# Altium schematic symbol library IC_ADI.SCHLIB: 3169 symbols (part 1 of 181) (continued)
## AD421BRZRL
designator U?
Single 16-Bit Loop-Powered Digital-to-Analog Converter, 4 to 20 mA, -40 to +85 degC, RW-16, Pb-Free, Reel; Generic Part Number: AD421; PartNumber: AD421BRZRL; # DAC Outputs: 1; Max V+: 5.05V; Op Pwr Diss: 1.95mW; Resolution (Bits): 16; Settling Time: 8ms; Single Supply: Yes; DatasheetVersion: Rev.C; PackageVersion: 032707-B; PackageReference: RW-16; PackageDescription: 16-Lead Standard Small Outline Package [SOIC_W]; Supplier Part Number 1: AD421BRZRLTR-ND; Supplier Part Number 2: AD421BRZRLCT-ND; Supplier Part Number 3: AD421BRZRLDKR-ND; Supplier Part Number 4: 59K3528; Supplier Part Number 5: 584-AD421BRZR; Packing: Reel; RoHS: Y; Mounting Technology: Surface Mount; Code_JEDEC: MS-013-AA; Code_IPC: SOIC127P1030-16; ComponentLink1Description: Manufacturer URL; ComponentLink2Description: Datasheet; ComponentLink3Description: Package Specification; ComponentLink4Description: Product URL
footprint SOIC16W_1.27 (Footprint not found)
pins: 1 REF OUT1 (out) "Reference Output 1. A precision +1.25 V reference is provided at this pin. It is intended as a precision reference source for other devices in the transmitter. REF OUT1 is a buffered output capable of providing up to 0.5 mA (See Datasheet)", 2 REF OUT2 (out) "Reference Output 2. A precision +2.5 V reference is provided at this pin. To operate the AD421 with its own reference, REF OUT2 should be connected to REF IN. It can also be used as a precision reference source for other (See Datasheet)", 3 REF IN (in) "Voltage Reference Input. The reference voltage for the AD421 is applied to this pin and it sets the span for the AD421. The nominal reference voltage for the AD421 is +2.5 V for correct operation. This can be supplied using (See Datasheet)", 4 LV (in) "Regulated Voltage Control Input. The LV input controls the loop gain of the servo amplifier to set VCC. With LV connected to COM, the regulator voltage is set to 5 V nominal. If the LV input is connected through 0.01 uF to (See Datasheet)", 5 LATCH (in) "DAC Latch Input. Logic Input. A rising edge of the LATCH signal loads the data from the serial input shift register to the DAC latch and hence updates the output of the DAC. The number of clock cycles provided between latch (See Datasheet)", 6 CLOCK (in) "Data Clock Input. Data on the DATA input is clocked into the shift register on the rising edge of this CLOCK input. The period of this clock equals the input serial data bit rate. This serial clock rate can be up to 10 MHz. (See Datasheet)", 7 DATA (in) "Data Input. The data to be loaded to the AD421 input shift register is applied to this input. Data should be valid on the rising edge of the CLOCK input.", 8 LOOP RTN (out) "Loop Return Output. LOOP RTN is the return path for current flowing in the current loop.", 9 COM (power) "Common. This is the reference potential for the AD421 analog and digital inputs and outputs and for the voltage regulator output.", 10 C3 "Filtering Capacitor. A low dielectric absorption capacitor ceramic capacitor should be connected between this pin and COM for internal filtering of the switched current sources", 11 C2 "Filtering Capacitor. See C3 description.", 12 C1 "Filtering Capacitor. See C3 description.", 13 DRIVE (out) "Output from the Voltage Regulator Loop. The DRIVE signal controls the external pass transistor to establish and maintain the correct VCC level programmed by the LV inputs while providing the necessary bias as the loop (See Datasheet)", 14 COMP (in) "Compensation Capacitor Input. A capacitor connected between COMP and DRIVE is required to stabilize the feedback loop formed with the regulator op amp and the external pass transistor.", 15 BOOST (in) "This open collector pin sinks the necessary current from the loop so that the current flowing into BOOST plus the current flowing into COM is equal to the programmed loop current", 16 VCC (power) "Power Supply. VCC is the power supply input of the AD421 and it also provides the voltage regulator output, driven by the external pass transistor. It is used both to bias the AD421 itself and to provide power for the rest (See Datasheet)"

## AD421BRZRL7
designator U?
Single 16-Bit Loop-Powered Digital-to-Analog Converter, 4 to 20 mA, -40 to +85 degC, RW-16, Pb-Free, Reel; Generic Part Number: AD421; PartNumber: AD421BRZRL7; # DAC Outputs: 1; Max V+: 5.05V; Op Pwr Diss: 1.95mW; Resolution (Bits): 16; Settling Time: 8ms; Single Supply: Yes; DatasheetVersion: Rev.C; PackageVersion: 032707-B; PackageReference: RW-16; PackageDescription: 16-Lead Standard Small Outline Package [SOIC_W]; Supplier Part Number 1: AD421BRZRL7TR-ND; Supplier Part Number 2: AD421BRZRL7CT-ND; Supplier Part Number 3: AD421BRZRL7DKR-ND; Supplier Part Number 4: 59K3529; Supplier Part Number 5: 584-AD421BRZR7; Packing: Reel; RoHS: Y; Mounting Technology: Surface Mount; Code_JEDEC: MS-013-AA; Code_IPC: SOIC127P1030-16; ComponentLink1Description: Manufacturer URL; ComponentLink2Description: Datasheet; ComponentLink3Description: Package Specification; ComponentLink4Description: Product URL
footprint SOIC16W_1.27 (Footprint not found)
pins: 1 REF OUT1 (out) "Reference Output 1. A precision +1.25 V reference is provided at this pin. It is intended as a precision reference source for other devices in the transmitter. REF OUT1 is a buffered output capable of providing up to 0.5 mA (See Datasheet)", 2 REF OUT2 (out) "Reference Output 2. A precision +2.5 V reference is provided at this pin. To operate the AD421 with its own reference, REF OUT2 should be connected to REF IN. It can also be used as a precision reference source for other (See Datasheet)", 3 REF IN (in) "Voltage Reference Input. The reference voltage for the AD421 is applied to this pin and it sets the span for the AD421. The nominal reference voltage for the AD421 is +2.5 V for correct operation. This can be supplied using (See Datasheet)", 4 LV (in) "Regulated Voltage Control Input. The LV input controls the loop gain of the servo amplifier to set VCC. With LV connected to COM, the regulator voltage is set to 5 V nominal. If the LV input is connected through 0.01 uF to (See Datasheet)", 5 LATCH (in) "DAC Latch Input. Logic Input. A rising edge of the LATCH signal loads the data from the serial input shift register to the DAC latch and hence updates the output of the DAC. The number of clock cycles provided between latch (See Datasheet)", 6 CLOCK (in) "Data Clock Input. Data on the DATA input is clocked into the shift register on the rising edge of this CLOCK input. The period of this clock equals the input serial data bit rate. This serial clock rate can be up to 10 MHz. (See Datasheet)", 7 DATA (in) "Data Input. The data to be loaded to the AD421 input shift register is applied to this input. Data should be valid on the rising edge of the CLOCK input.", 8 LOOP RTN (out) "Loop Return Output. LOOP RTN is the return path for current flowing in the current loop.", 9 COM (power) "Common. This is the reference potential for the AD421 analog and digital inputs and outputs and for the voltage regulator output.", 10 C3 "Filtering Capacitor. A low dielectric absorption capacitor ceramic capacitor should be connected between this pin and COM for internal filtering of the switched current sources", 11 C2 "Filtering Capacitor. See C3 description.", 12 C1 "Filtering Capacitor. See C3 description.", 13 DRIVE (out) "Output from the Voltage Regulator Loop. The DRIVE signal controls the external pass transistor to establish and maintain the correct VCC level programmed by the LV inputs while providing the necessary bias as the loop (See Datasheet)", 14 COMP (in) "Compensation Capacitor Input. A capacitor connected between COMP and DRIVE is required to stabilize the feedback loop formed with the regulator op amp and the external pass transistor.", 15 BOOST (in) "This open collector pin sinks the necessary current from the loop so that the current flowing into BOOST plus the current flowing into COM is equal to the programmed loop current", 16 VCC (power) "Power Supply. VCC is the power supply input of the AD421 and it also provides the voltage regulator output, driven by the external pass transistor. It is used both to bias the AD421 itself and to provide power for the rest (See Datasheet)"

## AD557JN
designator U?
Single 8-Bit Low Cost Complete uP-Compatible DACPORT, 0 to +70 degC, N-16, Tube; Generic Part Number: AD557; PartNumber: AD557JN; # DAC Outputs: 1; Max V+: 5.5V; Op Pwr Diss: 125mW; Resolution (Bits): 8; Settling Time: 800ns; Single Supply: Yes; DatasheetVersion: Rev.B; PackageVersion: 070706-A; PackageReference: N-16; PackageDescription: 16-Lead Plastic Dual In-Line Package [PDIP] Narrow Body; Supplier Part Number 1: AD557JN-ND; Supplier Part Number 2: 584-AD557JN; Packing: Tube; RoHS: N; Mounting Technology: Through Hole; Code_JEDEC: MS-001; ComponentLink1Description: Manufacturer URL; ComponentLink2Description: Datasheet; ComponentLink3Description: Package Specification; ComponentLink4Description: Product URL
footprint DIP16 (Footprint not found)
pins: 1 (LSB) BIT 8 (in), 2 BIT 7 (in), 3 BIT 6 (in), 4 BIT 5 (in), 5 BIT 4 (in), 6 BIT 3 (in), 7 BIT 2 (in), 8 (MSB) BIT 1 (in), 9 ~{CE} (in), 10 ~{CS} (in), 11 +VCC (power), 12 GND (power), 13 GND (power), 14 VOUT SENSE B (in), 15 VOUT SENSE A (in), 16 VOUT (out)

## AD558JD
designator U?
Single 8-Bit Low Cost Complete uP-Compatible DACPORT, 0 to +70 degC, D-16, Tube; Generic Part Number: AD558; PartNumber: AD558JD; # DAC Outputs: 1; Max V+: 16.5V; Op Pwr Diss: 375mW; Resolution (Bits): 8; Settling Time: 800ns; Single Supply: Yes; DatasheetVersion: Rev.A; PackageVersion: Oct-2004; PackageReference: D-16; PackageDescription: 16-Lead Side-Brazed Ceramic Dual In-Line Package [SBDIP]; Supplier Part Number 1: AD558JD-ND; Supplier Part Number 2: 05F6976; Supplier Part Number 3: 584-AD558JD; Packing: Tube; RoHS: N; Mounting Technology: Through Hole; ComponentLink1Description: Manufacturer URL; ComponentLink2Description: Datasheet; ComponentLink3Description: Package Specification; ComponentLink4Description: Product URL
footprint DIP16 (Footprint not found)
pins: 1 (LSB)  DB0 (in), 2 DB1 (in), 3 DB2 (in), 4 DB3 (in), 5 DB4 (in), 6 DB5 (in), 7 DB6 (in), 8 (MSB) DB7 (in), 9 ~{CE} (in), 10 ~{CS} (in), 11 +VCC (power), 12 GND (power), 13 GND (power), 14 VOUTSELECT (in), 15 VOUTSENSE (in), 16 VOUT (out)

## AD558JN
designator U?
Single 8-Bit Low Cost Complete uP-Compatible DACPORT, 0 to +70 degC, N-16, Tube; Generic Part Number: AD558; PartNumber: AD558JN; # DAC Outputs: 1; Max V+: 16.5V; Op Pwr Diss: 375mW; Resolution (Bits): 8; Settling Time: 800ns; Single Supply: Yes; DatasheetVersion: Rev.A; PackageVersion: 070706-A; PackageReference: N-16; PackageDescription: 16-Lead Plastic Dual In-Line Package [PDIP] Narrow Body; Supplier Part Number 1: AD558JN-ND; Supplier Part Number 2: 584-AD558JN; Packing: Tube; RoHS: N; Mounting Technology: Through Hole; Code_JEDEC: MS-001; ComponentLink1Description: Manufacturer URL; ComponentLink2Description: Datasheet; ComponentLink3Description: Package Specification; ComponentLink4Description: Product URL
footprint DIP16 (Footprint not found)
pins: 1 (LSB) DB0 (in), 2 DB1 (in), 3 DB2 (in), 4 DB3 (in), 5 DB4 (in), 6 DB5 (in), 7 DB6 (in), 8 (MSB) DB7 (in), 9 ~{CE} (in), 10 ~{CS} (in), 11 +VCC (power), 12 GND (power), 13 GND (power), 14 VOUT SELECT (in), 15 VOUT SENSE (in), 16 VOUT (out)

## AD558JP
designator U?
Single 8-Bit Low Cost Complete uP-Compatible DACPORT, 0 to +70 degC, P-20A, Tube; Generic Part Number: AD558; PartNumber: AD558JP; # DAC Outputs: 1; Max V+: 16.5V; Op Pwr Diss: 375mW; Resolution (Bits): 8; Settling Time: 800ns; Single Supply: Yes; DatasheetVersion: Rev.A; PackageVersion: Nov-2002; PackageReference: P-20A; PackageDescription: 20-Lead Plastic Leaded Chip Carrier [PLCC]; Supplier Part Number 1: AD558JP-ND; Supplier Part Number 2: 05F6978; Supplier Part Number 3: 584-AD558JP; Packing: Tube; RoHS: N; Mounting Technology: Surface Mount; Code_JEDEC: MO-047-AA; ComponentLink1Description: Manufacturer URL; ComponentLink2Description: Datasheet; ComponentLink3Description: Package Specification; ComponentLink4Description: Product URL
footprint PLCC-20N (Footprint not found)
pins: 1 NC, 2 DB0 (LSB) (in), 3 DB1 (in), 4 DB2 (in), 5 DB3 (in), 6 NC, 7 DB4 (in), 8 DB5 (in), 9 DB6 (in), 10 (MSB) DB7 (in), 11 NC, 12 ~{CE} (in), 13 ~{CS} (in), 14 +VCC (power), 15 GND (power), 16 NC, 17 GND (power), 18 VOUT SELECT (in), 19 VOUT SENSE (in), 20 VOUT (out)

## AD558KD
designator U?
Single 8-Bit Low Cost Complete uP-Compatible DACPORT, 0 to +70 degC, D-16, Tube; Generic Part Number: AD558; PartNumber: AD558KD; # DAC Outputs: 1; Max V+: 16.5V; Op Pwr Diss: 375mW; Resolution (Bits): 8; Settling Time: 800ns; Single Supply: Yes; DatasheetVersion: Rev.A; PackageVersion: Oct-2004; PackageReference: D-16; PackageDescription: 16-Lead Side-Brazed Ceramic Dual In-Line Package [SBDIP]; Supplier Part Number 1: AD558KD-ND; Supplier Part Number 2: 05F6979; Supplier Part Number 3: 584-AD558KD; Packing: Tube; RoHS: N; Mounting Technology: Through Hole; ComponentLink1Description: Manufacturer URL; ComponentLink2Description: Datasheet; ComponentLink3Description: Package Specification; ComponentLink4Description: Product URL
footprint DIP16 (Footprint not found)
pins: 1 (LSB)  DB0 (in), 2 DB1 (in), 3 DB2 (in), 4 DB3 (in), 5 DB4 (in), 6 DB5 (in), 7 DB6 (in), 8 (MSB) DB7 (in), 9 ~{CE} (in), 10 ~{CS} (in), 11 +VCC (power), 12 GND (power), 13 GND (power), 14 VOUTSELECT (in), 15 VOUTSENSE (in), 16 VOUT (out)

## AD558KN
designator U?
Single 8-Bit Low Cost Complete uP-Compatible DACPORT, 0 to +70 degC, N-16, Tube; Generic Part Number: AD558; PartNumber: AD558KN; # DAC Outputs: 1; Max V+: 16.5V; Op Pwr Diss: 375mW; Resolution (Bits): 8; Settling Time: 800ns; Single Supply: Yes; DatasheetVersion: Rev.A; PackageVersion: 070706-A; PackageReference: N-16; PackageDescription: 16-Lead Plastic Dual In-Line Package [PDIP] Narrow Body; Supplier Part Number 1: AD558KN-ND; Supplier Part Number 2: 584-AD558KN; Packing: Tube; RoHS: N; Mounting Technology: Through Hole; Code_JEDEC: MS-001; ComponentLink1Description: Manufacturer URL; ComponentLink2Description: Datasheet; ComponentLink3Description: Package Specification; ComponentLink4Description: Product URL
footprint DIP16 (Footprint not found)
pins: 1 (LSB) DB0 (in), 2 DB1 (in), 3 DB2 (in), 4 DB3 (in), 5 DB4 (in), 6 DB5 (in), 7 DB6 (in), 8 (MSB) DB7 (in), 9 ~{CE} (in), 10 ~{CS} (in), 11 +VCC (power), 12 GND (power), 13 GND (power), 14 VOUT SELECT (in), 15 VOUT SENSE (in), 16 VOUT (out)

## AD558KP
designator U?
Single 8-Bit Low Cost Complete uP-Compatible DACPORT, 0 to +70 degC, P-20A, Tube; Generic Part Number: AD558; PartNumber: AD558KP; # DAC Outputs: 1; Max V+: 16.5V; Op Pwr Diss: 375mW; Resolution (Bits): 8; Settling Time: 800ns; Single Supply: Yes; DatasheetVersion: Rev.A; PackageVersion: Nov-2002; PackageReference: P-20A; PackageDescription: 20-Lead Plastic Leaded Chip Carrier [PLCC]; Supplier Part Number 1: AD558KP-ND; Supplier Part Number 2: 584-AD558KP; Packing: Tube; RoHS: N; Mounting Technology: Surface Mount; Code_JEDEC: MO-047-AA; ComponentLink1Description: Manufacturer URL; ComponentLink2Description: Datasheet; ComponentLink3Description: Package Specification; ComponentLink4Description: Product URL
footprint PLCC-20N (Footprint not found)
pins: 1 NC, 2 DB0 (LSB) (in), 3 DB1 (in), 4 DB2 (in), 5 DB3 (in), 6 NC, 7 DB4 (in), 8 DB5 (in), 9 DB6 (in), 10 (MSB) DB7 (in), 11 NC, 12 ~{CE} (in), 13 ~{CS} (in), 14 +VCC (power), 15 GND (power), 16 NC, 17 GND (power), 18 VOUT SELECT (in), 19 VOUT SENSE (in), 20 VOUT (out)

## AD558KPZ
designator U?
Single 8-Bit Low Cost Complete uP-Compatible DACPORT, 0 to +70 degC, P-20A, Pb-Free, Tube; Generic Part Number: AD558; PartNumber: AD558KPZ; # DAC Outputs: 1; Max V+: 16.5V; Op Pwr Diss: 375mW; Resolution (Bits): 8; Settling Time: 800ns; Single Supply: Yes; DatasheetVersion: Rev.A; PackageVersion: Nov-2002; PackageReference: P-20A; PackageDescription: 20-Lead Plastic Leaded Chip Carrier [PLCC]; Supplier Part Number 1: AD558KPZ-ND; Supplier Part Number 2: 59K4253; Supplier Part Number 3: 584-AD558KPZ; Packing: Tube; RoHS: Y; Mounting Technology: Surface Mount; Code_JEDEC: MO-047-AA; ComponentLink1Description: Manufacturer URL; ComponentLink2Description: Datasheet; ComponentLink3Description: Package Specification; ComponentLink4Description: Product URL
footprint PLCC-20N (Footprint not found)
pins: 1 NC, 2 DB0 (LSB) (in), 3 DB1 (in), 4 DB2 (in), 5 DB3 (in), 6 NC, 7 DB4 (in), 8 DB5 (in), 9 DB6 (in), 10 (MSB) DB7 (in), 11 NC, 12 ~{CE} (in), 13 ~{CS} (in), 14 +VCC (power), 15 GND (power), 16 NC, 17 GND (power), 18 VOUT SELECT (in), 19 VOUT SENSE (in), 20 VOUT (out)

## AD558SD
designator U?
Single 8-Bit Low Cost Complete uP-Compatible DACPORT, -55 to +125 degC, D-16, Tube; Generic Part Number: AD558; PartNumber: AD558SD; # DAC Outputs: 1; Max V+: 16.5V; Op Pwr Diss: 375mW; Resolution (Bits): 8; Settling Time: 800ns; Single Supply: Yes; DatasheetVersion: Rev.A; PackageVersion: Oct-2004; PackageReference: D-16; PackageDescription: 16-Lead Side-Brazed Ceramic Dual In-Line Package [SBDIP]; Supplier Part Number 1: AD558SD-ND; Supplier Part Number 2: 584-AD558SD; Packing: Tube; RoHS: N; Mounting Technology: Through Hole; ComponentLink1Description: Manufacturer URL; ComponentLink2Description: Datasheet; ComponentLink3Description: Package Specification; ComponentLink4Description: Product URL
footprint DIP16 (Footprint not found)
pins: 1 (LSB)  DB0 (in), 2 DB1 (in), 3 DB2 (in), 4 DB3 (in), 5 DB4 (in), 6 DB5 (in), 7 DB6 (in), 8 (MSB) DB7 (in), 9 ~{CE} (in), 10 ~{CS} (in), 11 +VCC (power), 12 GND (power), 13 GND (power), 14 VOUTSELECT (in), 15 VOUTSENSE (in), 16 VOUT (out)

## AD558SD/883B
designator U?
Single 8-Bit Low Cost Complete uP-Compatible DACPORT, -55 to +125 degC, D-16, Tube; Generic Part Number: AD558; PartNumber: AD558SD/883B; # DAC Outputs: 1; Max V+: 16.5V; Op Pwr Diss: 375mW; Resolution (Bits): 8; Settling Time: 800ns; Single Supply: Yes; DatasheetVersion: Rev.A; PackageVersion: Oct-2004; PackageReference: D-16; PackageDescription: 16-Lead Side-Brazed Ceramic Dual In-Line Package [SBDIP]; Supplier Part Number 1: 584-AD558SD883B; Packing: Tube; RoHS: N; Mounting Technology: Through Hole; ComponentLink1Description: Manufacturer URL; ComponentLink2Description: Datasheet; ComponentLink3Description: Package Specification; ComponentLink4Description: Product URL
footprint DIP16 (Footprint not found)
pins: 1 (LSB)  DB0 (in), 2 DB1 (in), 3 DB2 (in), 4 DB3 (in), 5 DB4 (in), 6 DB5 (in), 7 DB6 (in), 8 (MSB) DB7 (in), 9 ~{CE} (in), 10 ~{CS} (in), 11 +VCC (power), 12 GND (power), 13 GND (power), 14 VOUTSELECT (in), 15 VOUTSENSE (in), 16 VOUT (out)

## AD558SE/883B
designator U?
Single 8-Bit Low Cost Complete uP-Compatible DACPORT, -55 to +125 degC, E-20-1, Tube; Generic Part Number: AD558; PartNumber: AD558SE/883B; # DAC Outputs: 1; Max V+: 16.5V; Op Pwr Diss: 375mW; Resolution (Bits): 8; Settling Time: 800ns; Single Supply: Yes; DatasheetVersion: Rev.A; PackageVersion: 022106-A; PackageReference: E-20-1; PackageDescription: 20-Terminal Ceramic Leadless Chip Carrier [LCC]; Supplier Part Number 1: 584-AD558SE883B; Packing: Tube; RoHS: N; Mounting Technology: Surface Mount; ComponentLink1Description: Manufacturer URL; ComponentLink2Description: Datasheet; ComponentLink3Description: Package Specification; ComponentLink4Description: Product URL
footprint PLCC-20N (Footprint not found)
pins: 1 NC, 2 DB0 (LSB) (in), 3 DB1 (in), 4 DB2 (in), 5 DB3 (in), 6 NC, 7 DB4 (in), 8 DB5 (in), 9 DB6 (in), 10 (MSB) DB7 (in), 11 NC, 12 ~{CE} (in), 13 ~{CS} (in), 14 +VCC (power), 15 GND (power), 16 NC, 17 GND (power), 18 VOUT SELECT (in), 19 VOUT SENSE (in), 20 VOUT (out)

## AD558TD
designator U?
Single 8-Bit Low Cost Complete uP-Compatible DACPORT, -55 to +125 degC, D-16, Tube; Generic Part Number: AD558; PartNumber: AD558TD; # DAC Outputs: 1; Max V+: 16.5V; Op Pwr Diss: 375mW; Resolution (Bits): 8; Settling Time: 800ns; Single Supply: Yes; DatasheetVersion: Rev.A; PackageVersion: Oct-2004; PackageReference: D-16; PackageDescription: 16-Lead Side-Brazed Ceramic Dual In-Line Package [SBDIP]; Supplier Part Number 1: AD558TD-ND; Supplier Part Number 2: 05F6983; Supplier Part Number 3: 584-AD558TD; Packing: Tube; RoHS: N; Mounting Technology: Through Hole; ComponentLink1Description: Manufacturer URL; ComponentLink2Description: Datasheet; ComponentLink3Description: Package Specification; ComponentLink4Description: Product URL
footprint DIP16 (Footprint not found)
pins: 1 (LSB)  DB0 (in), 2 DB1 (in), 3 DB2 (in), 4 DB3 (in), 5 DB4 (in), 6 DB5 (in), 7 DB6 (in), 8 (MSB) DB7 (in), 9 ~{CE} (in), 10 ~{CS} (in), 11 +VCC (power), 12 GND (power), 13 GND (power), 14 VOUTSELECT (in), 15 VOUTSENSE (in), 16 VOUT (out)

## AD558TD/883B
designator U?
Single 8-Bit Low Cost Complete uP-Compatible DACPORT, -55 to +125 degC, D-16, Tube; Generic Part Number: AD558; PartNumber: AD558TD/883B; # DAC Outputs: 1; Max V+: 16.5V; Op Pwr Diss: 375mW; Resolution (Bits): 8; Settling Time: 800ns; Single Supply: Yes; DatasheetVersion: Rev.A; PackageVersion: Oct-2004; PackageReference: D-16; PackageDescription: 16-Lead Side-Brazed Ceramic Dual In-Line Package [SBDIP]; Supplier Part Number 1: 584-AD558TD883B; Packing: Tube; RoHS: N; Mounting Technology: Through Hole; ComponentLink1Description: Manufacturer URL; ComponentLink2Description: Datasheet; ComponentLink3Description: Package Specification; ComponentLink4Description: Product URL
footprint DIP16 (Footprint not found)
pins: 1 (LSB)  DB0 (in), 2 DB1 (in), 3 DB2 (in), 4 DB3 (in), 5 DB4 (in), 6 DB5 (in), 7 DB6 (in), 8 (MSB) DB7 (in), 9 ~{CE} (in), 10 ~{CS} (in), 11 +VCC (power), 12 GND (power), 13 GND (power), 14 VOUTSELECT (in), 15 VOUTSENSE (in), 16 VOUT (out)

## AD558TE/883B
designator U?
Single 8-Bit Low Cost Complete uP-Compatible DACPORT, -55 to +125 degC, E-20-1, Tube; Generic Part Number: AD558; PartNumber: AD558TE/883B; # DAC Outputs: 1; Max V+: 16.5V; Op Pwr Diss: 375mW; Resolution (Bits): 8; Settling Time: 800ns; Single Supply: Yes; DatasheetVersion: Rev.A; PackageVersion: 022106-A; PackageReference: E-20-1; PackageDescription: 20-Terminal Ceramic Leadless Chip Carrier [LCC]; Supplier Part Number 1: 584-AD558TE883B; Packing: Tube; RoHS: N; Mounting Technology: Surface Mount; ComponentLink1Description: Manufacturer URL; ComponentLink2Description: Datasheet; ComponentLink3Description: Package Specification; ComponentLink4Description: Product URL
footprint PLCC-20N (Footprint not found)
pins: 1 NC, 2 DB0 (LSB) (in), 3 DB1 (in), 4 DB2 (in), 5 DB3 (in), 6 NC, 7 DB4 (in), 8 DB5 (in), 9 DB6 (in), 10 (MSB) DB7 (in), 11 NC, 12 ~{CE} (in), 13 ~{CS} (in), 14 +VCC (power), 15 GND (power), 16 NC, 17 GND (power), 18 VOUT SELECT (in), 19 VOUT SENSE (in), 20 VOUT (out)

## AD586AR
designator U?
High Precision Reference, 5 V Output, 10.8 to 36 V Supply, Industrial, 8-pin SOIC (R-8), Tube; PartNumber: AD586AR; Ref Out TC (ppm/C): 15; Vout: 5V; DatasheetVersion: Rev. G; PackageVersion: 060506-A, 06/2006; PackageReference: R-8; PackageDescription: 8-Pin Standard Small Outline Package, Body 4.9 x 3.9 mm, Pitch 1.27 mm; Supplier Part Number 1: AD586AR-ND; Supplier Part Number 2: 584-AD586AR; Packing: Tube; Operating Temp Range: -40 to 85 degC; Mounting Technology: Surface Mount; Code_JEDEC: MS-012-AA; ComponentLink1Description: Manufacturer URL; ComponentLink2Description: Datasheet; ComponentLink3Description: Package Specification; ComponentLink4Description: URL Link1
footprint SOIC8_1.27 (Footprint not found)
part A pins: 2 VIN (power) "Input Voltage.", 4 GND (power) "Ground.", 5 TRIM (in) "Optional External Fine Trim. See the Applying the AD586 section.", 6 VOUT (power) "Output Voltage.", 8 NR "Optional Noise Reduction Filter with External 1uF Capacitor to Ground."
part B pins: 1 TP "Factory Trim Pad (No Connect).", 3 TP "Factory Trim Pad (No Connect).", 7 TP "Factory Trim Pad (No Connect)."

## AD586BR
designator U?
High Precision Reference, 5 V Output, 10.8 to 36 V Supply, Industrial, 8-pin SOIC (R-8), Tube; PartNumber: AD586BR; Ref Out TC (ppm/C): 5; Vout: 5V; DatasheetVersion: Rev. G; PackageVersion: 060506-A, 06/2006; PackageReference: R-8; PackageDescription: 8-Pin Standard Small Outline Package, Body 4.9 x 3.9 mm, Pitch 1.27 mm; Supplier Part Number 1: AD586BR-ND; Supplier Part Number 2: N/A; Packing: Tube; Operating Temp Range: -40 to 85 degC; Mounting Technology: Surface Mount; Code_JEDEC: MS-012-AA; ComponentLink1Description: Manufacturer URL; ComponentLink2Description: Datasheet; ComponentLink3Description: Package Specification; ComponentLink4Description: URL Link1
footprint SOIC8_1.27 (Footprint not found)
part A pins: 2 VIN (power) "Input Voltage.", 4 GND (power) "Ground.", 5 TRIM (in) "Optional External Fine Trim. See the Applying the AD586 section.", 6 VOUT (power) "Output Voltage.", 8 NR "Optional Noise Reduction Filter with External 1uF Capacitor to Ground."
part B pins: 1 TP "Factory Trim Pad (No Connect).", 3 TP "Factory Trim Pad (No Connect).", 7 TP "Factory Trim Pad (No Connect)."

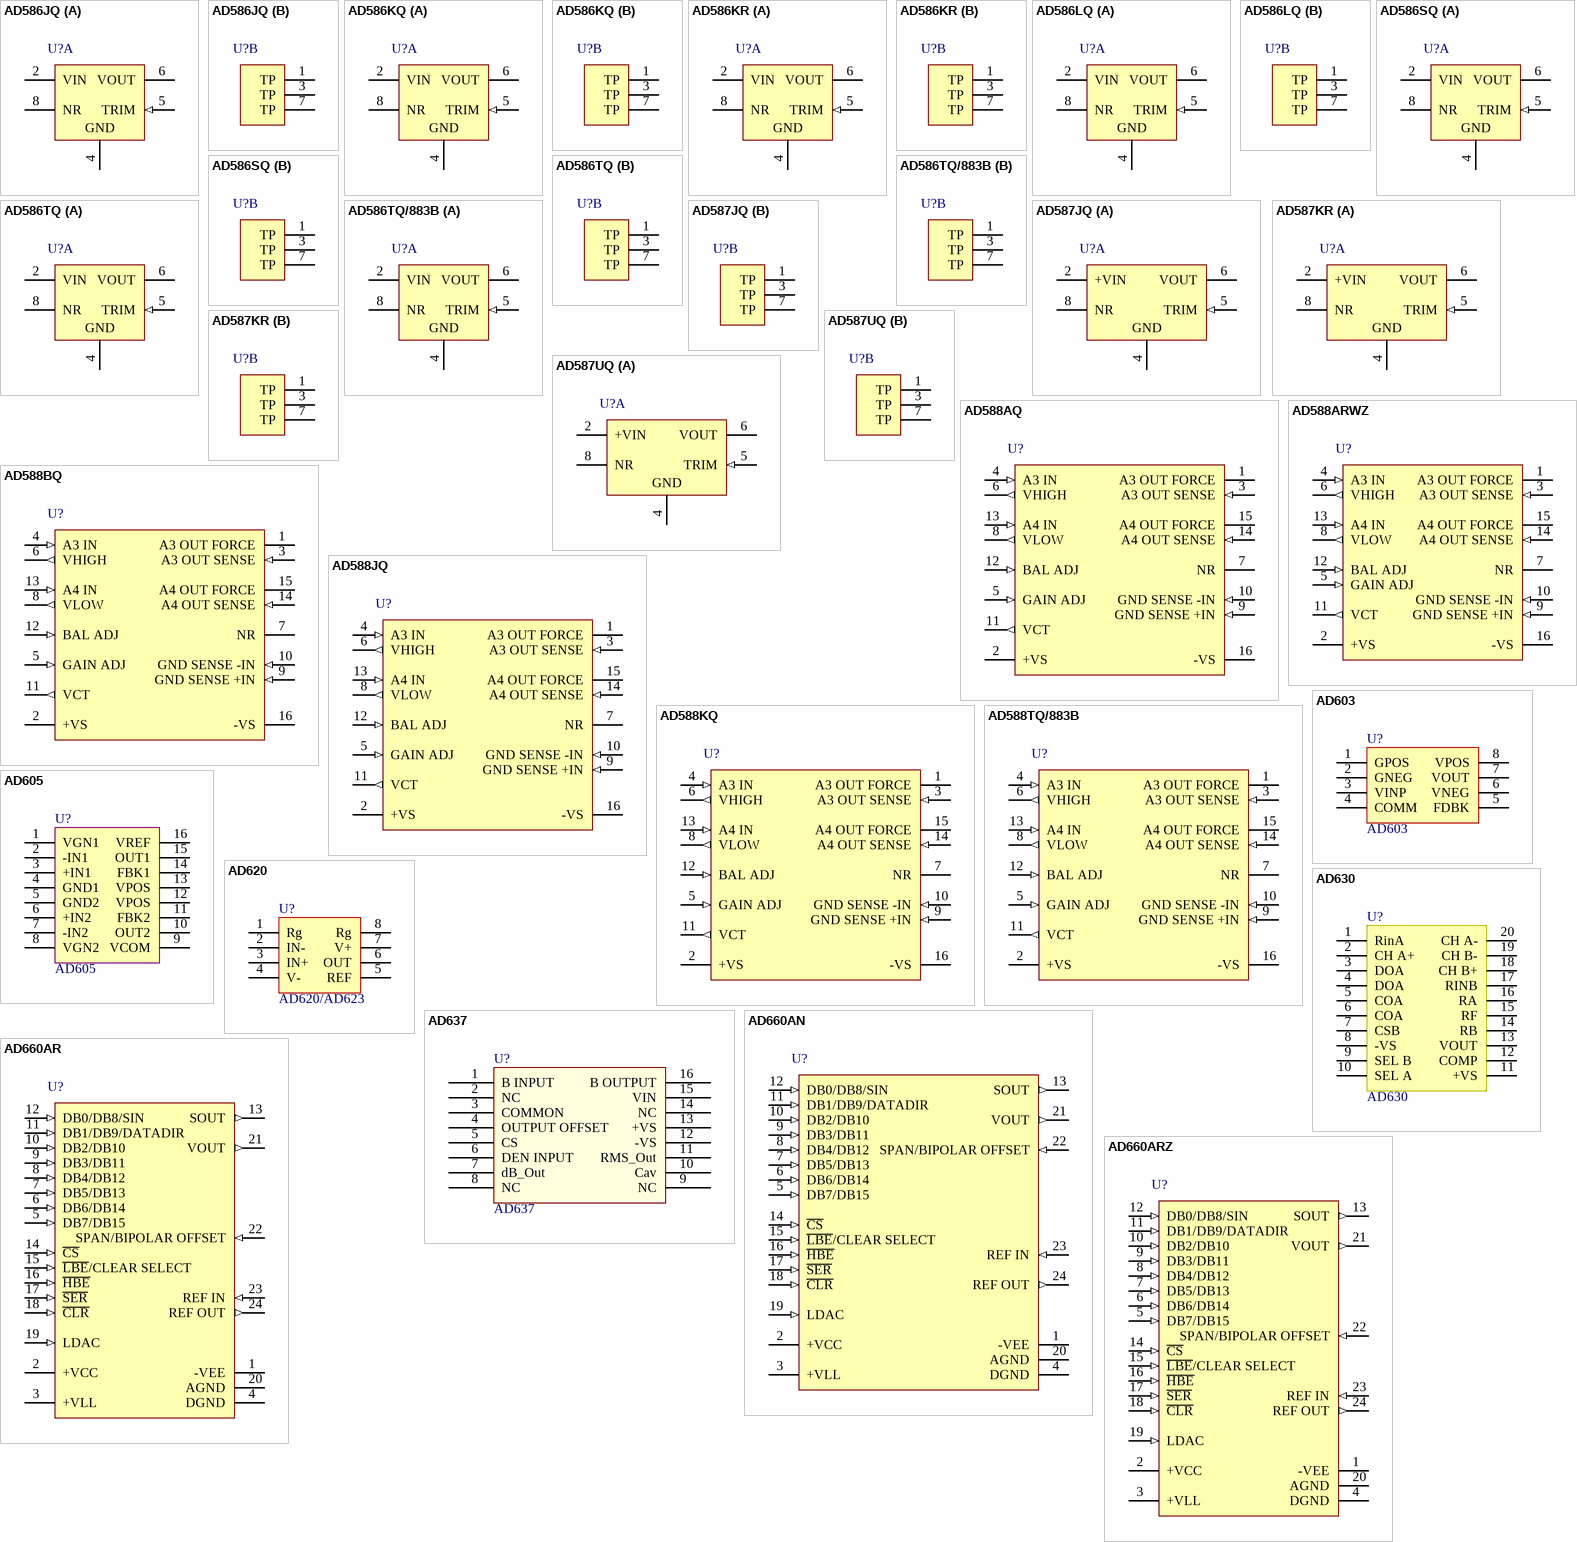
[diagram p1: symbols AD586JQ to AD660ARZ]

## AD586JQ
designator U?
High Precision Reference, 5 V Output, 10.8 to 36 V Supply, Commercial, 8-pin DIP (Q-8), Tube; PartNumber: AD586JQ; Ref Out TC (ppm/C): 25; Vout: 5V; DatasheetVersion: Rev. G; PackageVersion: Aug-05; PackageReference: Q-8; PackageDescription: 8-Pin Ceramic Dual In-Line Package, Row spacing 7.62 mm, Pitch 2.54 mm; Supplier Part Number 1: AD586JQ-ND; Supplier Part Number 2: 584-AD586JQ; Packing: Tube; Operating Temp Range: 0 to 70 degC; Mounting Technology: Through Hole; ComponentLink1Description: Manufacturer URL; ComponentLink2Description: Datasheet; ComponentLink3Description: Package Specification; ComponentLink4Description: URL Link1
footprint DIP8 (Footprint not found)
part A pins: 2 VIN (power) "Input Voltage.", 4 GND (power) "Ground.", 5 TRIM (in) "Optional External Fine Trim. See the Applying the AD586 section.", 6 VOUT (power) "Output Voltage.", 8 NR "Optional Noise Reduction Filter with External 1uF Capacitor to Ground."
part B pins: 1 TP "Factory Trim Pad (No Connect).", 3 TP "Factory Trim Pad (No Connect).", 7 TP "Factory Trim Pad (No Connect)."

## AD586KQ
designator U?
High Precision Reference, 5 V Output, 10.8 to 36 V Supply, Commercial, 8-pin DIP (Q-8), Tube; PartNumber: AD586KQ; Ref Out TC (ppm/C): 15; Vout: 5V; DatasheetVersion: Rev. G; PackageVersion: Aug-05; PackageReference: Q-8; PackageDescription: 8-Pin Ceramic Dual In-Line Package, Row spacing 7.62 mm, Pitch 2.54 mm; Supplier Part Number 1: AD586KQ-ND; Supplier Part Number 2: 584-AD586KQ; Packing: Tube; Operating Temp Range: 0 to 70 degC; Mounting Technology: Through Hole; ComponentLink1Description: Manufacturer URL; ComponentLink2Description: Datasheet; ComponentLink3Description: Package Specification; ComponentLink4Description: URL Link1
footprint DIP8 (Footprint not found)
part A pins: 2 VIN (power) "Input Voltage.", 4 GND (power) "Ground.", 5 TRIM (in) "Optional External Fine Trim. See the Applying the AD586 section.", 6 VOUT (power) "Output Voltage.", 8 NR "Optional Noise Reduction Filter with External 1uF Capacitor to Ground."
part B pins: 1 TP "Factory Trim Pad (No Connect).", 3 TP "Factory Trim Pad (No Connect).", 7 TP "Factory Trim Pad (No Connect)."

## AD586KR
designator U?
High Precision Reference, 5 V Output, 10.8 to 36 V Supply, Commercial, 8-pin SOIC (R-8), Tube; PartNumber: AD586KR; Ref Out TC (ppm/C): 15; Vout: 5V; DatasheetVersion: Rev. G; PackageVersion: 060506-A, 06/2006; PackageReference: R-8; PackageDescription: 8-Pin Standard Small Outline Package, Body 4.9 x 3.9 mm, Pitch 1.27 mm; Supplier Part Number 1: AD586KR-ND; Supplier Part Number 2: 584-AD586KR; Packing: Tube; Operating Temp Range: 0 to 70 degC; Mounting Technology: Surface Mount; Code_JEDEC: MS-012-AA; ComponentLink1Description: Manufacturer URL; ComponentLink2Description: Datasheet; ComponentLink3Description: Package Specification; ComponentLink4Description: URL Link1
footprint SOIC8_1.27 (Footprint not found)
part A pins: 2 VIN (power) "Input Voltage.", 4 GND (power) "Ground.", 5 TRIM (in) "Optional External Fine Trim. See the Applying the AD586 section.", 6 VOUT (power) "Output Voltage.", 8 NR "Optional Noise Reduction Filter with External 1uF Capacitor to Ground."
part B pins: 1 TP "Factory Trim Pad (No Connect).", 3 TP "Factory Trim Pad (No Connect).", 7 TP "Factory Trim Pad (No Connect)."

## AD586LQ
designator U?
High Precision Reference, 5 V Output, 10.8 to 36 V Supply, Commercial, 8-pin DIP (Q-8), Tube; PartNumber: AD586LQ; Ref Out TC (ppm/C): 5; Vout: 5V; DatasheetVersion: Rev. G; PackageVersion: Aug-05; PackageReference: Q-8; PackageDescription: 8-Pin Ceramic Dual In-Line Package, Row spacing 7.62 mm, Pitch 2.54 mm; Supplier Part Number 1: AD586LQ-ND; Supplier Part Number 2: 2230227; Supplier Part Number 3: 584-AD586LQ; Packing: Tube; Operating Temp Range: 0 to 70 degC; Mounting Technology: Through Hole; ComponentLink1Description: Manufacturer URL; ComponentLink2Description: Datasheet; ComponentLink3Description: Package Specification; ComponentLink4Description: URL Link1
footprint DIP8 (Footprint not found)
part A pins: 2 VIN (power) "Input Voltage.", 4 GND (power) "Ground.", 5 TRIM (in) "Optional External Fine Trim. See the Applying the AD586 section.", 6 VOUT (power) "Output Voltage.", 8 NR "Optional Noise Reduction Filter with External 1uF Capacitor to Ground."
part B pins: 1 TP "Factory Trim Pad (No Connect).", 3 TP "Factory Trim Pad (No Connect).", 7 TP "Factory Trim Pad (No Connect)."

## AD586SQ
designator U?
High Precision Reference, 5 V Output, 10.8 to 36 V Supply, Military, 8-pin DIP (Q-8), Tube; PartNumber: AD586SQ; Ref Out TC (ppm/C): 20; Vout: 5V; DatasheetVersion: Rev. G; PackageVersion: Aug-05; PackageReference: Q-8; PackageDescription: 8-Pin Ceramic Dual In-Line Package, Row spacing 7.62 mm, Pitch 2.54 mm; Supplier Part Number 1: AD586SQ-ND; Supplier Part Number 2: 584-AD586SQ; Packing: Tube; Operating Temp Range: -40 to 125 degC; Mounting Technology: Through Hole; ComponentLink1Description: Manufacturer URL; ComponentLink2Description: Datasheet; ComponentLink3Description: Package Specification; ComponentLink4Description: URL Link1
footprint DIP8 (Footprint not found)
part A pins: 2 VIN (power) "Input Voltage.", 4 GND (power) "Ground.", 5 TRIM (in) "Optional External Fine Trim. See the Applying the AD586 section.", 6 VOUT (power) "Output Voltage.", 8 NR "Optional Noise Reduction Filter with External 1uF Capacitor to Ground."
part B pins: 1 TP "Factory Trim Pad (No Connect).", 3 TP "Factory Trim Pad (No Connect).", 7 TP "Factory Trim Pad (No Connect)."

## AD586TQ
designator U?
High Precision Reference, 5 V Output, 10.8 to 36 V Supply, Military, 8-pin DIP (Q-8), Tube; PartNumber: AD586TQ; Ref Out TC (ppm/C): 10; Vout: 5V; DatasheetVersion: Rev. G; PackageVersion: Aug-05; PackageReference: Q-8; PackageDescription: 8-Pin Ceramic Dual In-Line Package, Row spacing 7.62 mm, Pitch 2.54 mm; Supplier Part Number 1: AD586TQ-ND; Supplier Part Number 2: 584-AD586TQ; Packing: Tube; Operating Temp Range: -40 to 125 degC; Mounting Technology: Through Hole; ComponentLink1Description: Manufacturer URL; ComponentLink2Description: Datasheet; ComponentLink3Description: Package Specification; ComponentLink4Description: URL Link1
footprint DIP8 (Footprint not found)
part A pins: 2 VIN (power) "Input Voltage.", 4 GND (power) "Ground.", 5 TRIM (in) "Optional External Fine Trim. See the Applying the AD586 section.", 6 VOUT (power) "Output Voltage.", 8 NR "Optional Noise Reduction Filter with External 1uF Capacitor to Ground."
part B pins: 1 TP "Factory Trim Pad (No Connect).", 3 TP "Factory Trim Pad (No Connect).", 7 TP "Factory Trim Pad (No Connect)."

## AD586TQ/883B
designator U?
High Precision Reference, 5 V Output, 10.8 to 36 V Supply, Military, 8-pin DIP (Q-8), Tube; PartNumber: AD586TQ/883B; Ref Out TC (ppm/C): 10; Vout: 5V; DatasheetVersion: Rev. G; PackageVersion: Aug-05; PackageReference: Q-8; PackageDescription: 8-Pin Ceramic Dual In-Line Package, Row spacing 7.62 mm, Pitch 2.54 mm; Supplier Part Number 1: 584-AD586TQ883B; Packing: Tube; Operating Temp Range: -40 to 125 degC; Mounting Technology: Through Hole; ComponentLink1Description: Manufacturer URL; ComponentLink2Description: Datasheet; ComponentLink3Description: Package Specification; ComponentLink4Description: URL Link1
footprint DIP8 (Footprint not found)
part A pins: 2 VIN (power) "Input Voltage.", 4 GND (power) "Ground.", 5 TRIM (in) "Optional External Fine Trim. See the Applying the AD586 section.", 6 VOUT (power) "Output Voltage.", 8 NR "Optional Noise Reduction Filter with External 1uF Capacitor to Ground."
part B pins: 1 TP "Factory Trim Pad (No Connect).", 3 TP "Factory Trim Pad (No Connect).", 7 TP "Factory Trim Pad (No Connect)."